# Altium footprint library SwagePCB.PcbLib: 114 footprints (part 8 of 8)
Each footprint in its own frame and in the unit in brackets; x right, y up, seen from the top. Pads: shape width x height; smd on the part's side, far side on the other; paste and mask are expansions set on the pad; w line width, h text height; cw(c..) or ccw(c..) is an arc to the next point about the centre after c.
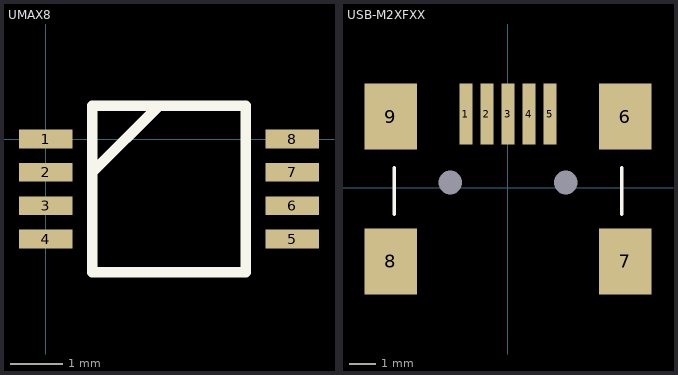
[diagram p7: the footprints below, top view; thin cyan lines are the x and y axes]

## UMAX8 [mil]
pads (8):
  rect 40x14 smd: 1(0,0) 2(0,-25) 3(0,-50) 4(0,-75) 5(185,-75) 6(185,-50) 7(185,-25) 8(185,0)
Top Overlay:
  lines w8: 35,-25 85,25 ; 35,-100 150,-100 150,25 35,25 35,-100

## USB-M2XFXX [mm] "Mini USB Connector SMT Board Mount B Type"
height 3.95
pads (11):
  round 0 hole 0.9 unplated: 0(-2.2,0.2) 0(2.2,0.2)
  rect 0.5x2.3 smd: 1(-1.6,2.8) 2(-0.8,2.8) 3(0,2.8) 4(0.8,2.8) 5(1.6,2.8)
  rect 2x2.5 smd: 6(4.45,2.7) 7(4.45,-2.8) 8(-4.45,-2.8) 9(-4.45,2.7)
Top Overlay:
  lines w0.127: -4.318,-1.01 -4.318,0.768 ; 4.318,-1.01 4.318,0.768
3D body: height 3.95, standoff 0, extent -3.302,-3.556 3.302,3.81